# Altium footprint library North POLE.PcbLib: 419 footprints (part 11 of 27)
Each footprint in its own frame and in the unit in brackets; x right, y up, seen from the top. Pads: shape width x height; smd on the part's side, far side on the other; paste and mask are expansions set on the pad; w line width, h text height; cw(c..) or ccw(c..) is an arc to the next point about the centre after c.
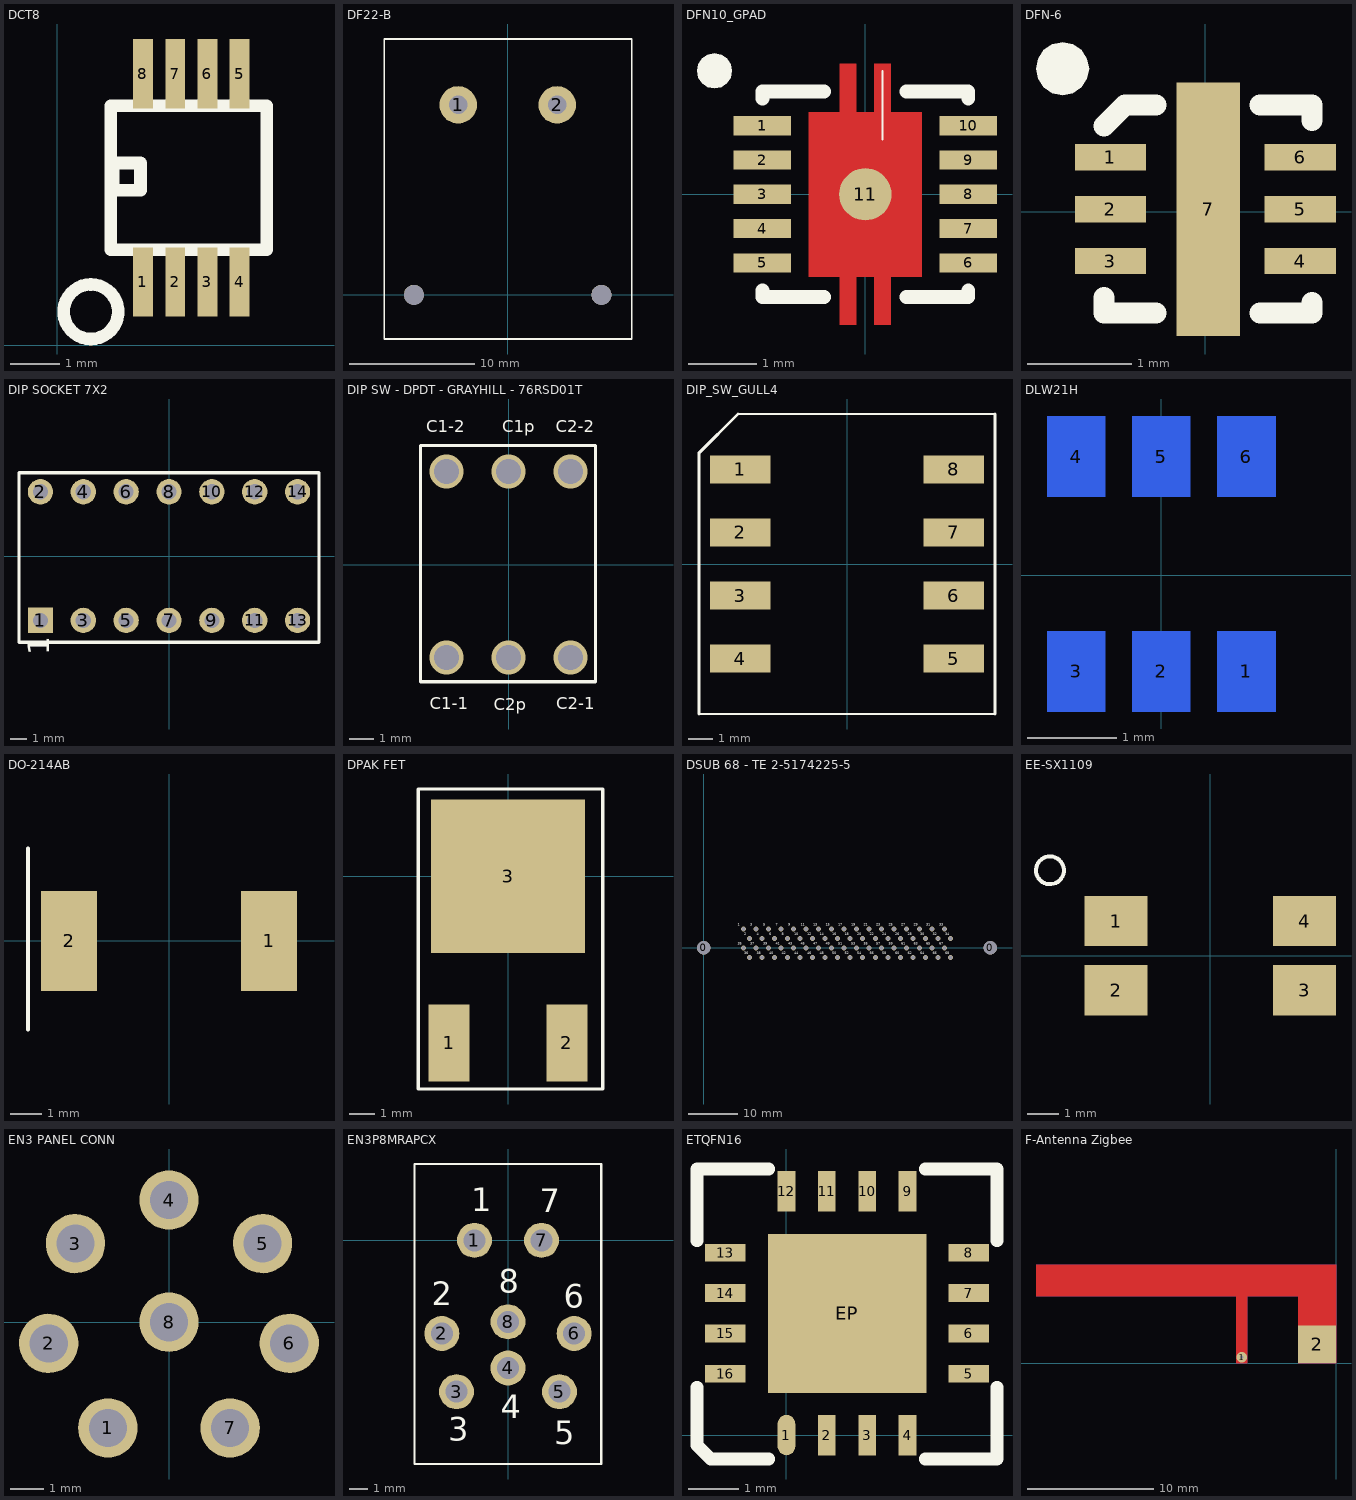
[diagram p10: the footprints below, top view; thin cyan lines are the x and y axes]

## DCT8 [mm]
pads (8):
  rect 0.4x1.4 smd paste-0.05 mask+0.1: 1(1.727,1.277) 2(2.377,1.277) 3(3.027,1.277) 4(3.677,1.277) 5(3.677,5.477) 6(3.027,5.477) 7(2.377,5.477) 8(1.727,5.477)
Top Overlay:
  lines w0.254: 0.677,0.127 cw(c0.677,0.677) 0.677,1.227 cw(c0.677,0.677) 0.677,0.127 ; 1.077,1.927 4.227,1.927 4.227,4.827 1.077,4.827 1.077,1.927 ; 1.127,3.127 1.677,3.127 1.677,3.677 1.127,3.677 1.127,3.127

## DF22-B [mm]
pads (4):
  round 3 hole 1.5 mask+0.08: 1(-3.96,15.2) 2(3.96,15.2)
  round 1.6 hole 1.6 unplated mask+0.08: ""(-7.5,0) ""(7.5,0)
Top Overlay:
  lines w0.127: -9.875,20.428 -9.875,-3.531 9.925,-3.531 9.925,20.469 -9.875,20.469
3D body: height 12.29, standoff -3.61, extent -9.875,-3.531 9.925,20.469

## DFN10_GPAD [mil]
pads (11):
  rect 33x11 smd paste+0 mask+5: 1(-59.06,39.37) 2(-59.06,19.68) 3(-59.06,0) 4(-59.06,-19.68) 5(-59.06,-39.37) 6(59.06,-39.37) 7(59.06,-19.68) 8(59.06,0) 9(59.06,19.68) 10(59.06,39.37)
  round 30 smd paste+0 mask+5: 11(0,0)
Top Layer:
  region: -32.48,-47.24 -32.48,47.24 -14.57,47.24 -14.57,74.8 -5.12,74.8 -5.12,47.24 5.12,47.24 5.12,74.8 14.57,74.8 14.57,47.24 32.48,47.24 32.48,-47.24 14.57,-47.24 14.57,-74.8 5.12,-74.8 5.12,-47.24 -5.12,-47.24 -5.12,-74.8 -14.57,-74.8 -14.57,-47.24
Top Overlay:
  region: -86.61,60.83 -90.45,61.59 -93.71,63.77 -95.89,67.03 -96.65,70.87 -95.89,74.71 -93.71,77.96 -90.45,80.14 -86.61,80.9 -82.77,80.14 -79.52,77.96 -77.34,74.71 -76.58,70.87 -77.34,67.03 -79.52,63.77 -82.77,61.59
  lines w1: 9.84,31.5 9.84,70.87
  lines w8: -59.06,-55.12 -59.06,-59.06 -23.62,-59.06 ; -59.06,55.12 -59.06,59.06 -23.62,59.06 ; 23.62,-59.06 59.06,-59.06 59.06,-55.12 ; 23.62,59.06 59.06,59.06 59.06,55.12
Top Paste:
  region: -27.56,-43.31 27.56,-43.31 27.56,-23.62 -27.56,-23.62
  region: -27.56,23.62 27.56,23.62 27.56,43.31 -27.56,43.31
  region: -27.56,-7.87 27.56,-7.87 27.56,11.81 -27.56,11.81
Top Solder:
  region: -32.48,-47.24 -32.48,47.24 -14.57,47.24 -14.57,74.8 -5.12,74.8 -5.12,47.24 5.12,47.24 5.12,74.8 14.57,74.8 14.57,47.24 32.48,47.24 32.48,-47.24 14.57,-47.24 14.57,-74.8 5.12,-74.8 5.12,-47.24 -5.12,-47.24 -5.12,-74.8 -14.57,-74.8 -14.57,-47.24

## DFN-6 [mil]
pads (7):
  rect 27x10 smd paste+0 mask+5: 1(-35.94,20.68) 2(-35.94,1) 3(-35.94,-18.68) 4(35.94,-18.68) 5(35.94,1) 6(35.94,20.68)
  rect 24x96 smd paste+0 mask+5: 7(1,1)
Top Overlay:
  region: -54.12,44.11 -57.96,44.88 -61.21,47.05 -63.39,50.31 -64.15,54.15 -63.39,57.99 -61.21,61.25 -57.96,63.42 -54.12,64.18 -50.28,63.42 -47.02,61.25 -44.85,57.99 -44.08,54.15 -44.85,50.31 -47.02,47.05 -50.28,44.88
  lines w8: -38.37,-32.46 -38.37,-38.37 -18.68,-38.37 ; -38.37,32.5 -30.5,40.37 -18.68,40.37 ; 20.68,-38.37 40.37,-38.37 40.37,-34.43 ; 20.68,40.37 40.37,40.37 40.37,34.46

## DIP SOCKET 7X2 [mm] "Connector; Header; 7x2 Position"
pads (14):
  rect 1.5x1.5 hole 0.9: 1(-7.62,-3.81)
  round 1.5 hole 0.9: 2(-7.62,3.81) 3(-5.08,-3.81) 4(-5.08,3.81) 5(-2.54,-3.81) 6(-2.54,3.81) 7(0,-3.81) 8(0,3.81) 9(2.54,-3.81) 10(2.54,3.81) 11(5.08,-3.81) 12(5.08,3.81) 13(7.62,-3.81) 14(7.62,3.81)
Top Overlay:
  lines w0.2: -8.89,-5.105 -8.89,4.928 8.89,4.928 8.89,-5.105 -8.89,-5.105
  text "1" at -7.087,-5.867 h1.27
3D body: height 5.08, standoff -3.33, extent -8.826,-5.004 8.827,5.004

## DIP SW - DPDT - GRAYHILL - 76RSD01T [mm]
via 0,3.81 diameter 1.397 hole 1.016
via -2.54,3.81 diameter 1.397 hole 1.016
via 2.54,3.81 diameter 1.397 hole 1.016
via -2.54,-3.81 diameter 1.397 hole 1.016
via 2.54,-3.81 diameter 1.397 hole 1.016
via 0,-3.81 diameter 1.397 hole 1.016
Top Overlay:
  lines w0.127: -3.607,-4.801 3.556,-4.801 3.556,4.877 -3.607,4.877 -3.607,-4.801
  text "C2-2" at 1.93,5.41 h0.5
  text "C1-2" at -3.378,5.41 h0.5
  text "C2-1" at 1.956,-5.918 h0.5
  text "C1-1" at -3.226,-5.918 h0.5
  text "C2p" at -0.61,-5.969 h0.5
  text "C1p" at -0.254,5.41 h0.5

## DIP_SW_GULL4 [mm]
pads (8):
  rect 2.44x1.13 smd: 1(-4.3,3.81) 2(-4.3,1.27) 3(-4.3,-1.27) 4(-4.3,-3.81) 5(4.3,-3.81) 6(4.3,-1.27) 7(4.3,1.27) 8(4.3,3.81)
Top Overlay:
  lines w0.1: -5.969,-6.045 5.969,-6.045 ; -4.394,6.045 5.969,6.045
  lines w0.127: -5.969,-6.045 -5.969,4.47 -4.394,6.045 ; 5.969,-6.045 5.969,6.045
3D body: height 4.28, standoff -0.02, extent -4.955,-5.815 4.955,5.815

## DLW21H [mm] "Chip inductor, Body 2.0x1.3mm, IPC Medium Density"
height 0.65
pads (6):
  rect 0.65x0.9 smd far side: 1(0.95,-1.073) 2(0,-1.073) 3(-0.95,-1.073) 4(-0.95,1.327) 5(0,1.327) 6(0.95,1.327)
Bottom Overlay:
  circle w0.25: c1.825,-1.073 r0.125
3D body: height 1.45, standoff 0, extent -1.55,-0.773 1.55,1.027

## DO-214AB [mil] "DO-214AB (SMC) Diode package"
pads (2):
  rect 70x125 smd mask+3.15: 1(125,0) 2(-125,0)
Top Overlay:
  lines w5: -176.38,-110.85 -176.38,115.35
3D body: height 90.75, standoff 0, extent -156.5,-115 156.5,117.28

## DPAK FET [mm]
pads (3):
  rect 1.6x3 smd mask+0.08: 1(-2.3,-6.5) 2(2.3,-6.5)
  rect 6x6 smd mask+0.08: 3(0,0)
Top Overlay:
  lines w0.127: -3.5,-8.3 3.7,-8.3 3.7,3.4 -3.5,3.4 -3.5,-8.3
3D body: height 2.3, standoff -0.01, extent -3.253,-7.415 3.327,2.285

## DSUB 68 - TE 2-5174225-5 [mm]
pads (2):
  round 2.7 hole 2.7 unplated: 0(0,0) 0(57.91,0)
via 48.64,0 diameter 1 hole 0.8
via 46.1,0 diameter 1 hole 0.8
via 43.56,0 diameter 1 hole 0.8
via 41.02,0 diameter 1 hole 0.8
via 38.48,0 diameter 1 hole 0.8
via 35.94,0 diameter 1 hole 0.8
via 33.4,0 diameter 1 hole 0.8
via 30.86,0 diameter 1 hole 0.8
via 28.32,0 diameter 1 hole 0.8
via 25.78,0 diameter 1 hole 0.8
via 23.24,0 diameter 1 hole 0.8
via 20.7,0 diameter 1 hole 0.8
via 18.16,0 diameter 1 hole 0.8
via 15.62,0 diameter 1 hole 0.8
via 13.08,0 diameter 1 hole 0.8
via 10.54,0 diameter 1 hole 0.8
via 9.27,-1.905 diameter 1 hole 0.8
via 11.81,-1.905 diameter 1 hole 0.8
via 14.35,-1.905 diameter 1 hole 0.8
via 16.89,-1.905 diameter 1 hole 0.8
via 19.43,-1.905 diameter 1 hole 0.8
via 21.97,-1.905 diameter 1 hole 0.8
via 24.51,-1.905 diameter 1 hole 0.8
via 27.05,-1.905 diameter 1 hole 0.8
via 29.59,-1.905 diameter 1 hole 0.8
via 32.13,-1.905 diameter 1 hole 0.8
via 34.67,-1.905 diameter 1 hole 0.8
via 37.21,-1.905 diameter 1 hole 0.8
via 39.75,-1.905 diameter 1 hole 0.8
via 42.29,-1.905 diameter 1 hole 0.8
via 44.83,-1.905 diameter 1 hole 0.8
via 47.37,-1.905 diameter 1 hole 0.8
via 49.91,-1.905 diameter 1 hole 0.8
via 8,0 diameter 1 hole 0.8
via 49.91,1.905 diameter 1 hole 0.8
via 47.37,1.905 diameter 1 hole 0.8
via 44.83,1.905 diameter 1 hole 0.8
via 42.29,1.905 diameter 1 hole 0.8
via 39.75,1.905 diameter 1 hole 0.8
via 37.21,1.905 diameter 1 hole 0.8
via 34.67,1.905 diameter 1 hole 0.8
via 32.13,1.905 diameter 1 hole 0.8
via 29.59,1.905 diameter 1 hole 0.8
via 27.05,1.905 diameter 1 hole 0.8
via 24.51,1.905 diameter 1 hole 0.8
via 21.97,1.905 diameter 1 hole 0.8
via 19.43,1.905 diameter 1 hole 0.8
via 16.89,1.905 diameter 1 hole 0.8
via 14.35,1.905 diameter 1 hole 0.8
via 11.81,1.905 diameter 1 hole 0.8
via 9.27,1.905 diameter 1 hole 0.8
via 8,3.81 diameter 1 hole 0.8
via 10.54,3.81 diameter 1 hole 0.8
via 13.08,3.81 diameter 1 hole 0.8
via 15.62,3.81 diameter 1 hole 0.8
via 18.16,3.81 diameter 1 hole 0.8
via 20.7,3.81 diameter 1 hole 0.8
via 23.24,3.81 diameter 1 hole 0.8
via 25.78,3.81 diameter 1 hole 0.8
via 28.32,3.81 diameter 1 hole 0.8
via 30.86,3.81 diameter 1 hole 0.8
via 33.4,3.81 diameter 1 hole 0.8
via 35.94,3.81 diameter 1 hole 0.8
via 38.48,3.81 diameter 1 hole 0.8
via 41.02,3.81 diameter 1 hole 0.8
via 43.56,3.81 diameter 1 hole 0.8
via 46.1,3.81 diameter 1 hole 0.8
via 48.64,3.81 diameter 1 hole 0.8
Top Overlay:
  text "36" at 8.178,-1.27 h0.5
  text "38" at 10.718,-1.27 h0.5
  text "40" at 13.258,-1.27 h0.5
  text "42" at 15.798,-1.27 h0.5
  text "44" at 18.338,-1.27 h0.5
  text "46" at 20.878,-1.27 h0.5
  text "48" at 23.418,-1.27 h0.5
  text "50" at 25.958,-1.27 h0.5
  text "52" at 28.498,-1.27 h0.5
  text "54" at 31.038,-1.27 h0.5
  text "56" at 33.578,-1.27 h0.5
  text "58" at 36.118,-1.27 h0.5
  text "60" at 38.658,-1.27 h0.5
  text "62" at 41.198,-1.27 h0.5
  text "64" at 43.738,-1.27 h0.5
  text "66" at 46.278,-1.27 h0.5
  text "68" at 48.818,-1.27 h0.5
  text "35" at 6.908,0.635 h0.5
  text "37" at 9.448,0.635 h0.5
  text "39" at 11.988,0.635 h0.5
  text "41" at 14.528,0.635 h0.5
  text "43" at 17.068,0.635 h0.5
  text "45" at 19.608,0.635 h0.5
  text "47" at 22.148,0.635 h0.5
  text "49" at 24.688,0.635 h0.5
  text "51" at 27.228,0.635 h0.5
  text "53" at 29.768,0.635 h0.5
  text "55" at 32.308,0.635 h0.5
  text "57" at 34.848,0.635 h0.5
  text "59" at 37.388,0.635 h0.5
  text "61" at 39.928,0.635 h0.5
  text "63" at 42.468,0.635 h0.5
  text "65" at 45.008,0.635 h0.5
  text "67" at 47.548,0.635 h0.5
  text "2" at 8.178,2.54 h0.5
  text "4" at 10.718,2.54 h0.5
  text "6" at 13.258,2.54 h0.5
  text "8" at 15.798,2.54 h0.5
  text "10" at 18.338,2.54 h0.5
  text "12" at 20.878,2.54 h0.5
  text "14" at 23.418,2.54 h0.5
  text "16" at 25.958,2.54 h0.5
  text "18" at 28.498,2.54 h0.5
  text "20" at 31.038,2.54 h0.5
  text "22" at 33.578,2.54 h0.5
  text "24" at 36.118,2.54 h0.5
  text "26" at 38.658,2.54 h0.5
  text "28" at 41.198,2.54 h0.5
  text "30" at 43.738,2.54 h0.5
  text "32" at 46.278,2.54 h0.5
  text "34" at 48.818,2.54 h0.5
  text "33" at 47.548,4.445 h0.5
  text "31" at 45.008,4.445 h0.5
  text "29" at 42.468,4.445 h0.5
  text "27" at 39.928,4.445 h0.5
  text "25" at 37.388,4.445 h0.5
  text "23" at 34.848,4.445 h0.5
  text "21" at 32.308,4.445 h0.5
  text "19" at 29.768,4.445 h0.5
  text "17" at 27.228,4.445 h0.5
  text "15" at 24.688,4.445 h0.5
  text "13" at 22.148,4.445 h0.5
  text "11" at 19.608,4.445 h0.5
  text "9" at 17.068,4.445 h0.5
  text "7" at 14.528,4.445 h0.5
  text "5" at 11.988,4.445 h0.5
  text "3" at 9.448,4.445 h0.5
  text "1" at 6.908,4.445 h0.5

## EE-SX1109 [mm]
pads (4):
  rect 2x1.6 smd: 1(-3,1.1) 2(-3,-1.1) 3(3,-1.1) 4(3,1.1)
Top Overlay:
  lines w0.127: -4.689,2.869 ccw(c-5.105,2.718) -4.674,2.819
3D body: height 5, standoff 0, extent -2.995,-1.98 3.005,2.02

## EN3 PANEL CONN [mil] "0.156-inch-separation 1x2 header with shroud"
pads (8):
  round 70 hole 45: 1(-72,-124.71) 2(-141.81,-25.01) 3(-110.31,92.56) 4(0,144) 5(110.31,92.56) 6(141.81,-25.01) 7(72,-124.71) 8(0,0)

## EN3P8MRAPCX [mil]
pads (8):
  round 75 hole 47 mask+3.15: 1(-72,0) 2(-142,-200) 3(-110.5,-325) 4(0,-274) 5(110.5,-325) 6(142,-200) 7(72,0) 8(0,-175)
Top Overlay:
  lines w5: 200,164 200,-480.31 -200.79,-480.31 -200.79,164 200.79,164
  text "4" at -16,-382 h50
  text "5" at 99,-438 h50
  text "6" at 120,-145 h50
  text "7" at 68,60 h50
  text "8" at -20,-113 h50
  text "3" at -128,-430 h50
  text "2" at -164,-139 h50
  text "1" at -79,63 h50

## ETQFN16 [mm]
pads (17):
  oval 0.35x0.8 smd: 1(0,0)
  rect 0.35x0.8 smd: 2(0.8,0) 3(1.6,0) 4(2.4,0) 9(2.4,4.83) 10(1.6,4.83) 11(0.8,4.83) 12(0,4.83)
  rect 0.8x0.35 smd: 5(3.615,1.215) 6(3.615,2.015) 7(3.615,2.815) 8(3.615,3.615) 13(-1.215,3.615) 14(-1.215,2.815) 15(-1.215,2.015) 16(-1.215,1.215)
  rect 3.15x3.15 smd: EP(1.205,2.414)
Top Overlay:
  lines w0.254: -1.773,0.95 -1.773,-0.2 -1.5,-0.473 -0.35,-0.473 ; -1.773,3.85 -1.773,5.273 -0.35,5.273 ; 2.75,-0.473 4.173,-0.473 4.173,0.95 ; 2.75,5.273 4.173,5.273 4.173,3.85

## F-Antenna Zigbee [mm]
pads (2):
  round 0.838 hole 0.305 paste-20 mask-20: 1(-7.475,0.465)
  rect 3x3 smd paste-20 mask-30: 2(-1.5,1.5)
Top Layer:
  region: -23.8,7.8 -23.8,5.3 -7.9,5.3 -7.9,0 -7.05,0 -7.05,5.3 -3,5.3 -3,0 0,0 0,7.8
Bottom Layer:
  region: -23.8,7.8 -23.8,5.3 -7.9,5.3 -7.9,0 -7.05,0 -7.05,5.3 -3,5.3 -3,0 0,0 0,7.8